# Altium schematic symbol library Regulator_Linear.SchLib: 1452 symbols (part 5 of 10) (continued)
## LT1117-2.85
designator *  value LT1117-2.85
ki_keywords: linear regulator ldo fixed positive; ki_description: 800mA Low-Dropout Linear Regulator, 2.85V fixed output, SOT-223/TO-263; ki_fp_filters: SOT?223* TO?263*; Supplier: https://www.analog.com/media/en/technical-documentation/data-sheets/1117fd.pdf
pins: 1 GND (power), 2 VO (power), 3 VI (power)

## LT1117-3.3
designator *  value LT1117-3.3
ki_keywords: linear regulator ldo fixed positive; ki_description: 800mA Low-Dropout Linear Regulator, 3.3V fixed output, SOT-223/TO-263; ki_fp_filters: SOT?223* TO?263*; Supplier: https://www.analog.com/media/en/technical-documentation/data-sheets/1117fd.pdf
pins: 1 GND (power), 2 VO (power), 3 VI (power)

## LT1117-5.0
designator *  value LT1117-5.0
ki_keywords: linear regulator ldo fixed positive; ki_description: 800mA Low-Dropout Linear Regulator, 5.0V fixed output, SOT-223/TO-263; ki_fp_filters: SOT?223* TO?263*; Supplier: https://www.analog.com/media/en/technical-documentation/data-sheets/1117fd.pdf
pins: 1 GND (power), 2 VO (power), 3 VI (power)

## LT1117-ADJ
designator *  value LT1117-ADJ
ki_keywords: linear regulator ldo adjustable positive; ki_description: 800mA Low-Dropout Linear Regulator, adjustable output, SOT-223/TO-263; ki_fp_filters: SOT?223* TO?263*; Supplier: https://www.analog.com/media/en/technical-documentation/data-sheets/1117fd.pdf
pins: 1 ADJ (in), 2 VO (power), 3 VI (power)

## LT1129-3.3_SO8
designator *  value LT1129-3.3_SO8
ki_keywords: LDO Linear Regulator positive fixed; ki_description: 700mA Micropower Low Dropout Linear Regulator, 3.3V output voltage, SO-8; ki_fp_filters: SOIC*3.9x4.9mm*P1.27mm*; Footprint: Package_SO:SOIC-8_3.9x4.9mm_P1.27mm; Supplier: https://www.analog.com/media/en/technical-documentation/data-sheets/112935ff.pdf
footprint SOIC-8_3.9x4.9mm_P1.27mm
pins: 1 OUT (power), 2 SENSE (in), 3 GND (power), 4 NC (in) hidden, 5 ~{{SHDN}} (in), 6 GND hidden, 7 GND hidden, 8 IN (power)

## LT1129-3.3_SOT223
designator *  value LT1129-3.3_SOT223
ki_keywords: REGULATOR LDO fixed positive; ki_description: 700mA Micropower Low drop-out regulator, Fixed Output 3.3V, SOT-223; ki_fp_filters: SOT?223*; Footprint: Package_TO_SOT_SMD:SOT-223-3_TabPin2; Supplier: https://www.analog.com/media/en/technical-documentation/data-sheets/112935ff.pdf
footprint SOT-223-3_TabPin2
pins: 1 VI (power), 2 GND (power), 3 VO (power)

## LT1129-3.3_TO220_TO263
designator *  value LT1129-3.3_TO220_TO263
ki_keywords: LDO Linear Regulator positive fixed; ki_description: 700mA Micropower Low Dropout Linear Regulator, 3.3V output voltage, TO-220-5/TO-263-5; ki_fp_filters: TO?220*Vertical*StaggerOdd* TO?263*TabPin3*; Supplier: https://www.analog.com/media/en/technical-documentation/data-sheets/112935ff.pdf
pins: 1 OUT (power), 2 SENSE (in), 3 GND (power), 4 ~{{SHDN}} (in), 5 IN (power)

## LT1129-5.0_SO8
designator *  value LT1129-5.0_SO8
ki_keywords: LDO Linear Regulator positive fixed; ki_description: 700mA Micropower Low Dropout Linear Regulator, 5.0V output voltage, SO-8; ki_fp_filters: SOIC*3.9x4.9mm*P1.27mm*; Footprint: Package_SO:SOIC-8_3.9x4.9mm_P1.27mm; Supplier: https://www.analog.com/media/en/technical-documentation/data-sheets/112935ff.pdf
footprint SOIC-8_3.9x4.9mm_P1.27mm
pins: 1 OUT (power), 2 SENSE (in), 3 GND (power), 4 NC (in) hidden, 5 ~{{SHDN}} (in), 6 GND hidden, 7 GND hidden, 8 IN (power)

## LT1129-5.0_SOT223
designator *  value LT1129-5.0_SOT223
ki_keywords: REGULATOR LDO Fixed Positive; ki_description: 700mA Micropower Low drop-out regulator, Fixed Output 5.0V, SOT-223; ki_fp_filters: SOT?223*; Footprint: Package_TO_SOT_SMD:SOT-223-3_TabPin2; Supplier: https://www.analog.com/media/en/technical-documentation/data-sheets/112935ff.pdf
footprint SOT-223-3_TabPin2
pins: 1 VI (power), 2 GND (power), 3 VO (power)

## LT1129-5.0_TO220_TO263
designator *  value LT1129-5.0_TO220_TO263
ki_keywords: LDO Linear Regulator positive fixed; ki_description: 700mA Micropower Low Dropout Linear Regulator, 5.0V output voltage, TO-220-5/TO-263-5; ki_fp_filters: TO?220*Vertical*StaggerOdd* TO?263*TabPin3*; Supplier: https://www.analog.com/media/en/technical-documentation/data-sheets/112935ff.pdf
pins: 1 OUT (power), 2 SENSE (in), 3 GND (power), 4 ~{{SHDN}} (in), 5 IN (power)

## LT1129-ADJ_SO8
designator *  value LT1129-ADJ_SO8
ki_keywords: LDO Linear Regulator positive adjustable; ki_description: 700mA Micropower Low Dropout Linear Regulator, adjustable output voltage, SO-8; ki_fp_filters: SOIC*3.9x4.9mm*P1.27mm*; Footprint: Package_SO:SOIC-8_3.9x4.9mm_P1.27mm; Supplier: https://www.analog.com/media/en/technical-documentation/data-sheets/112935ff.pdf
footprint SOIC-8_3.9x4.9mm_P1.27mm
pins: 1 OUT (power), 2 ADJ (in), 3 GND (power), 4 NC (in) hidden, 5 ~{{SHDN}} (in), 6 GND hidden, 7 GND hidden, 8 IN (power)

## LT1129-ADJ_TO220_TO263
designator *  value LT1129-ADJ_TO220_TO263
ki_keywords: LDO Linear Regulator positive adjustable; ki_description: 700mA Micropower Low Dropout Linear Regulator, adjustable output voltage, TO-220-5/TO-263-5; ki_fp_filters: TO?220*Vertical*StaggerOdd* TO?263*TabPin3*; Supplier: https://www.analog.com/media/en/technical-documentation/data-sheets/112935ff.pdf
pins: 1 OUT (power), 2 ADJ (in), 3 GND (power), 4 ~{{SHDN}} (in), 5 IN (power)

## LT1175-5_SO8_DIP8
designator *  value LT1175-5_SO8_DIP8
ki_keywords: linear regulator LDO negative fixed; ki_description: 500mA Negative Low Dropout Micropower Regulator, fixed output voltage -5V, SO-8/DIP-8; ki_fp_filters: SOIC*3.9x4.9mm*P1.27mm* DIP*W7.62mm*; Supplier: https://www.analog.com/media/en/technical-documentation/data-sheets/1175ff.pdf
pins: 1 Vin (power), 2 ILIM2 (in), 3 OUT (power), 4 SENSE (in), 5 GND (power), 6 ~{{SHDN}} (in), 7 ILIM4 (in), 8 Vin hidden

## LT1175-5_SOT223
designator *  value LT1175-5_SOT223
ki_keywords: linear regulator LDO negative fixed; ki_description: 500mA Negative Low Dropout Micropower Regulator, fixed output voltage -5V, SOT-223; ki_fp_filters: SOT?223*; Footprint: Package_TO_SOT_SMD:SOT-223-3_TabPin2; Supplier: https://www.analog.com/media/en/technical-documentation/data-sheets/1175ff.pdf
footprint SOT-223-3_TabPin2
pins: 1 OUT (power), 2 IN (power), 3 GND (power)

## LT1175-5_TO263_TO220
designator *  value LT1175-5_TO263_TO220
ki_keywords: linear regulator LDO negative fixed; ki_description: 500mA Negative Low Dropout Micropower Regulator, fixed output voltage -5V, TO-220-5/TO-263; ki_fp_filters: TO?263* TO?220*; Supplier: https://www.analog.com/media/en/technical-documentation/data-sheets/1175ff.pdf
pins: 1 OUT (power), 2 SENSE (in), 3 IN (power), 4 GND (power), 5 ~{{SHDN}} (in)

## LT1175-ADJ_SO8_DIP8
designator *  value LT1175-ADJ_SO8_DIP8
ki_keywords: linear regulator LDO negative adjustable; ki_description: 500mA Negative Low Dropout Micropower Regulator, adjustable output voltage, SO-8/DIP-8; ki_fp_filters: SOIC*3.9x4.9mm*P1.27mm* DIP*W7.62mm*; Supplier: https://www.analog.com/media/en/technical-documentation/data-sheets/1175ff.pdf
pins: 1 Vin (power), 2 ILIM2 (in), 3 OUT (power), 4 SENSE (in), 5 GND (power), 6 ~{{SHDN}} (in), 7 ILIM4 (in), 8 Vin hidden

## LT1175-ADJ_SOT223
designator *  value LT1175-ADJ_SOT223
ki_keywords: linear regulator LDO negative adjustable; ki_description: 500mA Negative Low Dropout Micropower Regulator, adjustable output voltage, SOT-223; ki_fp_filters: SOT?223*; Footprint: Package_TO_SOT_SMD:SOT-223-3_TabPin2; Supplier: https://www.analog.com/media/en/technical-documentation/data-sheets/1175ff.pdf
footprint SOT-223-3_TabPin2
pins: 1 OUT (power), 2 IN (power), 3 GND (power)

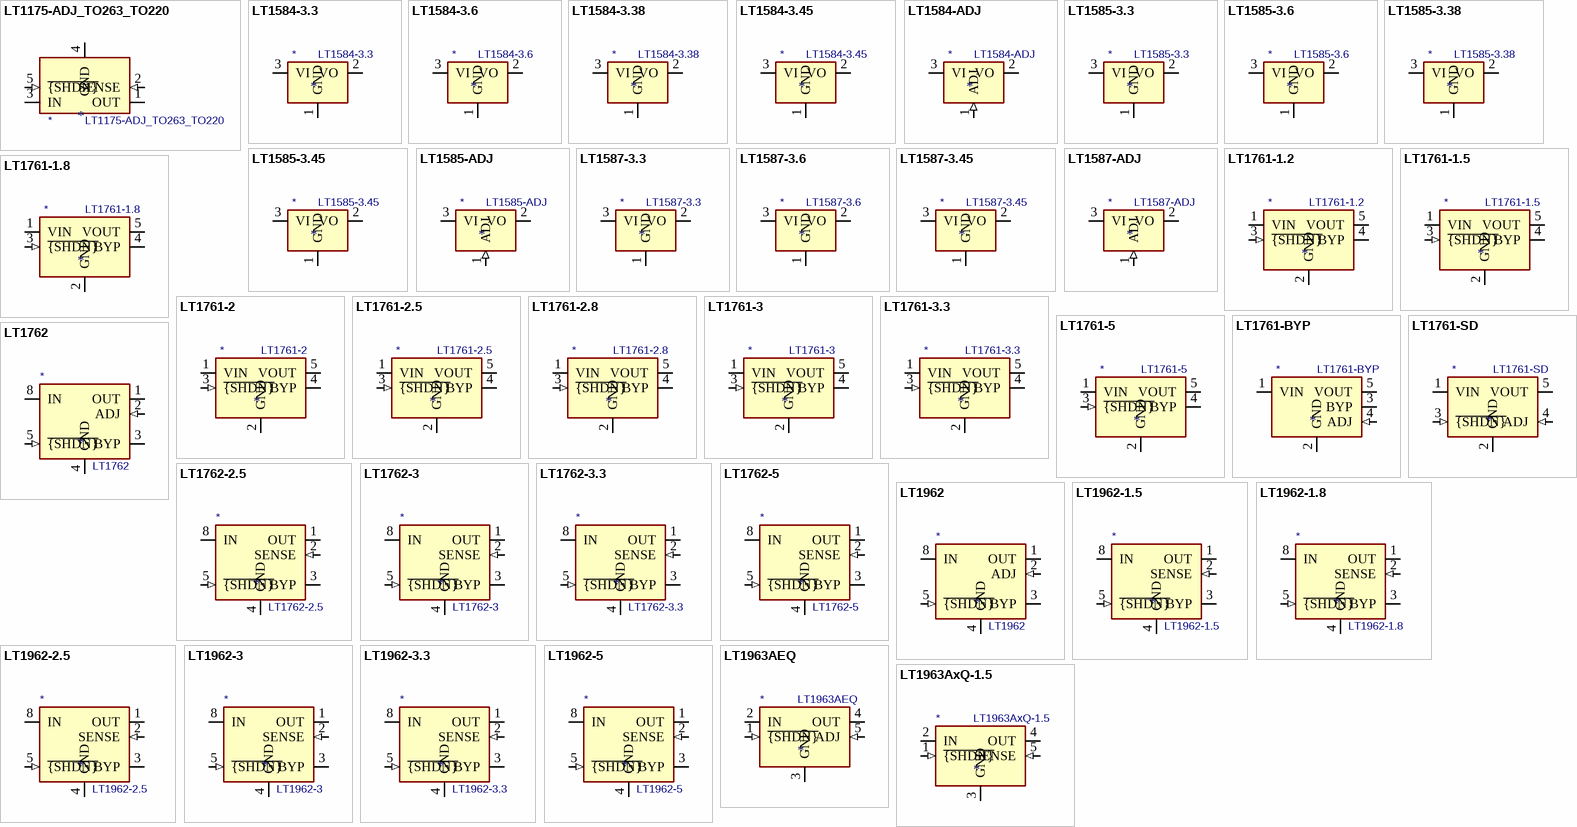
[diagram p18: symbols LT1175-ADJ_TO263_TO220 to LT1963AxQ-1.5]

## LT1175-ADJ_TO263_TO220
designator *  value LT1175-ADJ_TO263_TO220
ki_keywords: linear regulator LDO negative adjustable; ki_description: 500mA Negative Low Dropout Micropower Regulator, adjustable output voltage, TO-220-5/TO-263; ki_fp_filters: TO?263* TO?220*; Supplier: https://www.analog.com/media/en/technical-documentation/data-sheets/1175ff.pdf
pins: 1 OUT (power), 2 SENSE (in), 3 IN (power), 4 GND (power), 5 ~{{SHDN}} (in)

## LT1584-3.3
designator *  value LT1584-3.3
ki_keywords: Voltage Regulator 7A Positive Fixed; ki_description: Positive 7A 35V Low Dropout Fast Response Linear Regulator, Fixed Output 3.3V, TO-220/TO-263; ki_fp_filters: TO?220*; Footprint: Package_TO_SOT_THT:TO-220-3_Vertical; Supplier: https://www.analog.com/media/en/technical-documentation/data-sheets/158457a.pdf
footprint TO-220-3_Vertical
pins: 1 GND (power), 2 VO (power), 3 VI (power)

## LT1584-3.6
designator *  value LT1584-3.6
ki_keywords: Voltage Regulator 7A Positive Fixed; ki_description: Positive 7A 35V Low Dropout Fast Response Linear Regulator, Fixed Output 3.6V, TO-220/TO-263; ki_fp_filters: TO?220*; Footprint: Package_TO_SOT_THT:TO-220-3_Vertical; Supplier: https://www.analog.com/media/en/technical-documentation/data-sheets/158457a.pdf
footprint TO-220-3_Vertical
pins: 1 GND (power), 2 VO (power), 3 VI (power)

## LT1584-3.38
designator *  value LT1584-3.38
ki_keywords: Voltage Regulator 7A Positive Fixed; ki_description: Positive 7A 35V Low Dropout Fast Response Linear Regulator, Fixed Output 3.38V, TO-220/TO-263; ki_fp_filters: TO?220*; Footprint: Package_TO_SOT_THT:TO-220-3_Vertical; Supplier: https://www.analog.com/media/en/technical-documentation/data-sheets/158457a.pdf
footprint TO-220-3_Vertical
pins: 1 GND (power), 2 VO (power), 3 VI (power)

## LT1584-3.45
designator *  value LT1584-3.45
ki_keywords: Voltage Regulator 7A Positive Fixed; ki_description: Positive 7A 35V Low Dropout Fast Response Linear Regulator, Fixed Output 3.45V, TO-220/TO-263; ki_fp_filters: TO?220*; Footprint: Package_TO_SOT_THT:TO-220-3_Vertical; Supplier: https://www.analog.com/media/en/technical-documentation/data-sheets/158457a.pdf
footprint TO-220-3_Vertical
pins: 1 GND (power), 2 VO (power), 3 VI (power)

## LT1584-ADJ
designator *  value LT1584-ADJ
ki_keywords: Voltage Regulator 7A Positive Adjustable; ki_description: Positive 7A 35V Low Dropout Fast Response Linear Regulator, Adjustable Output, TO-220; ki_fp_filters: TO?220*; Footprint: Package_TO_SOT_THT:TO-220-3_Vertical; Supplier: https://www.analog.com/media/en/technical-documentation/data-sheets/158457a.pdf
footprint TO-220-3_Vertical
pins: 1 ADJ (in), 2 VO (power), 3 VI (power)

## LT1585-3.3
designator *  value LT1585-3.3
ki_keywords: Voltage Regulator 4.6A Positive Fixed; ki_description: Positive 4.6A 35V Low Dropout Fast Response Linear Regulator, Fixed Output 3.3V, TO-220/TO-263; ki_fp_filters: TO?220* TO?263*; Supplier: https://www.analog.com/media/en/technical-documentation/data-sheets/158457a.pdf
pins: 1 GND (power), 2 VO (power), 3 VI (power)

## LT1585-3.6
designator *  value LT1585-3.6
ki_keywords: Voltage Regulator 4.6A Positive Fixed; ki_description: Positive 4.6A 35V Low Dropout Fast Response Linear Regulator, Fixed Output 3.6V, TO-220/TO-263; ki_fp_filters: TO?220* TO?263*; Supplier: https://www.analog.com/media/en/technical-documentation/data-sheets/158457a.pdf
pins: 1 GND (power), 2 VO (power), 3 VI (power)

## LT1585-3.38
designator *  value LT1585-3.38
ki_keywords: Voltage Regulator 4.6A Positive Fixed; ki_description: Positive 4.6A 35V Low Dropout Fast Response Linear Regulator, Fixed Output 3.38V, TO-220/TO-263; ki_fp_filters: TO?220* TO?263*; Supplier: https://www.analog.com/media/en/technical-documentation/data-sheets/158457a.pdf
pins: 1 GND (power), 2 VO (power), 3 VI (power)

## LT1585-3.45
designator *  value LT1585-3.45
ki_keywords: Voltage Regulator 4.6A Positive Fixed; ki_description: Positive 4.6A 35V Low Dropout Fast Response Linear Regulator, Fixed Output 3.45V, TO-220/TO-263; ki_fp_filters: TO?220* TO?263*; Supplier: https://www.analog.com/media/en/technical-documentation/data-sheets/158457a.pdf
pins: 1 GND (power), 2 VO (power), 3 VI (power)

## LT1585-ADJ
designator *  value LT1585-ADJ
ki_keywords: Voltage Regulator 4.6A Positive Adjustable; ki_description: Positive 4.6A 35V Low Dropout Fast Response Linear Regulator, Adjustable Output, TO-220/TO-263; ki_fp_filters: TO?220* TO?263*; Supplier: https://www.analog.com/media/en/technical-documentation/data-sheets/158457a.pdf
pins: 1 ADJ (in), 2 VO (power), 3 VI (power)

## LT1587-3.3
designator *  value LT1587-3.3
ki_keywords: Voltage Regulator 3A Positive Fixed; ki_description: Positive 3A 35V Low Dropout Fast Response Linear Regulator, Fixed Output 3.3V, TO-220/TO-263; ki_fp_filters: TO?220* TO?263*; Supplier: https://www.analog.com/media/en/technical-documentation/data-sheets/158457a.pdf
pins: 1 GND (power), 2 VO (power), 3 VI (power)

## LT1587-3.6
designator *  value LT1587-3.6
ki_keywords: Voltage Regulator 3A Positive Fixed; ki_description: Positive 3A 35V Low Dropout Fast Response Linear Regulator, Fixed Output 3.6V, TO-220/TO-263; ki_fp_filters: TO?220* TO?263*; Supplier: https://www.analog.com/media/en/technical-documentation/data-sheets/158457a.pdf
pins: 1 GND (power), 2 VO (power), 3 VI (power)

## LT1587-3.45
designator *  value LT1587-3.45
ki_keywords: Voltage Regulator 3A Positive Fixed; ki_description: Positive 3A 35V Low Dropout Fast Response Linear Regulator, Fixed Output 3.45V, TO-220/TO-263; ki_fp_filters: TO?220* TO?263*; Supplier: https://www.analog.com/media/en/technical-documentation/data-sheets/158457a.pdf
pins: 1 GND (power), 2 VO (power), 3 VI (power)

## LT1587-ADJ
designator *  value LT1587-ADJ
ki_keywords: Voltage Regulator 3A Positive Adjustable; ki_description: Positive 3A 35V Low Dropout Fast Response Linear Regulator, Adjustable Output, TO-220/TO-263; ki_fp_filters: TO?220* TO?263*; Supplier: https://www.analog.com/media/en/technical-documentation/data-sheets/158457a.pdf
pins: 1 ADJ (in), 2 VO (power), 3 VI (power)

## LT1761-1.2
designator *  value LT1761-1.2
ki_keywords: REGULATOR POWER LDO POSITIVE; ki_description: MICROPOWER Low Noise 1.2V 100mA LDO regulator, TSOT-23-5; ki_fp_filters: TSOT?23*; Footprint: Package_TO_SOT_SMD:TSOT-23-5; Supplier: https://www.analog.com/media/en/technical-documentation/data-sheets/1761sff.pdf
footprint TSOT-23-5
pins: 1 VIN (power), 2 GND (power), 3 ~{{SHDN}} (in), 4 BYP, 5 VOUT (power)

## LT1761-1.5
designator *  value LT1761-1.5
ki_keywords: POWER LDO REGULATOR POSITIVE; ki_description: MICROPOWER Low Noise 1.5V 100mA LDO regulator, TSOT-23-5; ki_fp_filters: TSOT?23*; Footprint: Package_TO_SOT_SMD:TSOT-23-5; Supplier: https://www.analog.com/media/en/technical-documentation/data-sheets/1761sff.pdf
footprint TSOT-23-5
pins: 1 VIN (power), 2 GND (power), 3 ~{{SHDN}} (in), 4 BYP, 5 VOUT (power)

## LT1761-1.8
designator *  value LT1761-1.8
ki_keywords: REGULATOR POSITIVE POWER LDO; ki_description: MICROPOWER Low Noise 1.8V 100mA LDO regulator, TSOT-23-5; ki_fp_filters: TSOT?23*; Footprint: Package_TO_SOT_SMD:TSOT-23-5; Supplier: https://www.analog.com/media/en/technical-documentation/data-sheets/1761sff.pdf
footprint TSOT-23-5
pins: 1 VIN (power), 2 GND (power), 3 ~{{SHDN}} (in), 4 BYP, 5 VOUT (power)

## LT1761-2
designator *  value LT1761-2
ki_keywords: REGULATOR POSITIVE POWER LDO; ki_description: MICROPOWER Low Noise 2V 100mA LDO regulator, TSOT-23-5; ki_fp_filters: TSOT?23*; Footprint: Package_TO_SOT_SMD:TSOT-23-5; Supplier: https://www.analog.com/media/en/technical-documentation/data-sheets/1761sff.pdf
footprint TSOT-23-5
pins: 1 VIN (power), 2 GND (power), 3 ~{{SHDN}} (in), 4 BYP, 5 VOUT (power)

## LT1761-2.5
designator *  value LT1761-2.5
ki_keywords: REGULATOR POSITIVE POWER LDO; ki_description: MICROPOWER Low Noise 2.5V 100mA LDO regulator, TSOT-23-5; ki_fp_filters: TSOT?23*; Footprint: Package_TO_SOT_SMD:TSOT-23-5; Supplier: https://www.analog.com/media/en/technical-documentation/data-sheets/1761sff.pdf
footprint TSOT-23-5
pins: 1 VIN (power), 2 GND (power), 3 ~{{SHDN}} (in), 4 BYP, 5 VOUT (power)

## LT1761-2.8
designator *  value LT1761-2.8
ki_keywords: REGULATOR POSITIVE POWER LDO; ki_description: MICROPOWER Low Noise 2.8V 100mA LDO regulator, TSOT-23-5; ki_fp_filters: TSOT?23*; Footprint: Package_TO_SOT_SMD:TSOT-23-5; Supplier: https://www.analog.com/media/en/technical-documentation/data-sheets/1761sff.pdf
footprint TSOT-23-5
pins: 1 VIN (power), 2 GND (power), 3 ~{{SHDN}} (in), 4 BYP, 5 VOUT (power)

## LT1761-3
designator *  value LT1761-3
ki_keywords: REGULATOR POSITIVE POWER LDO; ki_description: MICROPOWER Low Noise 3V 100mA LDO regulator, TSOT-23-5; ki_fp_filters: TSOT?23*; Footprint: Package_TO_SOT_SMD:TSOT-23-5; Supplier: https://www.analog.com/media/en/technical-documentation/data-sheets/1761sff.pdf
footprint TSOT-23-5
pins: 1 VIN (power), 2 GND (power), 3 ~{{SHDN}} (in), 4 BYP, 5 VOUT (power)

## LT1761-3.3
designator *  value LT1761-3.3
ki_keywords: REGULATOR POSITIVE POWER LDO; ki_description: MICROPOWER Low Noise 3.3V 100mA LDO regulator, TSOT-23-5; ki_fp_filters: TSOT?23*; Footprint: Package_TO_SOT_SMD:TSOT-23-5; Supplier: https://www.analog.com/media/en/technical-documentation/data-sheets/1761sff.pdf
footprint TSOT-23-5
pins: 1 VIN (power), 2 GND (power), 3 ~{{SHDN}} (in), 4 BYP, 5 VOUT (power)

## LT1761-5
designator *  value LT1761-5
ki_keywords: REGULATOR POSITIVE POWER LDO; ki_description: MICROPOWER Low Noise 5V 100mA LDO regulator, TSOT-23-5; ki_fp_filters: TSOT?23*; Footprint: Package_TO_SOT_SMD:TSOT-23-5; Supplier: https://www.analog.com/media/en/technical-documentation/data-sheets/1761sff.pdf
footprint TSOT-23-5
pins: 1 VIN (power), 2 GND (power), 3 ~{{SHDN}} (in), 4 BYP, 5 VOUT (power)

## LT1761-BYP
designator *  value LT1761-BYP
ki_keywords: REGULATOR POSITIVE POWER LDO adjustable; ki_description: MICROPOWER 100mA LDO adjustable regulator, TSOT-23-5; ki_fp_filters: TSOT?23*; Footprint: Package_TO_SOT_SMD:TSOT-23-5; Supplier: https://www.analog.com/media/en/technical-documentation/data-sheets/1761sff.pdf
footprint TSOT-23-5
pins: 1 VIN (power), 2 GND (power), 3 BYP, 4 ADJ (in), 5 VOUT (power)

## LT1761-SD
designator *  value LT1761-SD
ki_keywords: REGULATOR POSITIVE POWER LDO adjustable; ki_description: MICROPOWER 100mA LDO adjustable regulator, TSOT-23-5; ki_fp_filters: TSOT?23*; Footprint: Package_TO_SOT_SMD:TSOT-23-5; Supplier: https://www.analog.com/media/en/technical-documentation/data-sheets/1761sff.pdf
footprint TSOT-23-5
pins: 1 VIN (power), 2 GND (power), 3 ~{{SHDN}} (in), 4 ADJ (in), 5 VOUT (power)

## LT1762
designator *  value LT1762
ki_keywords: LDO ADJ; ki_description: 150mA, Adjustable, Low Noise, Micropower LDO Regulator, MSOP-8; ki_fp_filters: MSOP*3x3mm*P0.65mm*; Footprint: Package_SO:MSOP-8_3x3mm_P0.65mm; Supplier: https://www.analog.com/media/en/technical-documentation/data-sheets/LT1762.pdf
footprint MSOP-8_3x3mm_P0.65mm
pins: 1 OUT (power), 2 ADJ (in), 3 BYP, 4 GND (power), 5 ~{{SHDN}} (in), 6 NC (in) hidden, 7 NC (in) hidden, 8 IN (power)

## LT1762-2.5
designator *  value LT1762-2.5
ki_keywords: LDO ADJ; ki_description: 2.5V, 150mA, Low Noise, Micropower LDO Regulator, MSOP-8; ki_fp_filters: MSOP*3x3mm*P0.65mm*; Footprint: Package_SO:MSOP-8_3x3mm_P0.65mm; Supplier: https://www.analog.com/media/en/technical-documentation/data-sheets/LT1762.pdf
footprint MSOP-8_3x3mm_P0.65mm
pins: 1 OUT (power), 2 SENSE (in), 3 BYP, 4 GND (power), 5 ~{{SHDN}} (in), 6 NC (in) hidden, 7 NC (in) hidden, 8 IN (power)

## LT1762-3
designator *  value LT1762-3
ki_keywords: LDO ADJ; ki_description: 3V, 150mA, Low Noise, Micropower LDO Regulator, MSOP-8; ki_fp_filters: MSOP*3x3mm*P0.65mm*; Footprint: Package_SO:MSOP-8_3x3mm_P0.65mm; Supplier: https://www.analog.com/media/en/technical-documentation/data-sheets/LT1762.pdf
footprint MSOP-8_3x3mm_P0.65mm
pins: 1 OUT (power), 2 SENSE (in), 3 BYP, 4 GND (power), 5 ~{{SHDN}} (in), 6 NC (in) hidden, 7 NC (in) hidden, 8 IN (power)

## LT1762-3.3
designator *  value LT1762-3.3
ki_keywords: LDO ADJ; ki_description: 3.3V, 150mA, Low Noise, Micropower LDO Regulator, MSOP-8; ki_fp_filters: MSOP*3x3mm*P0.65mm*; Footprint: Package_SO:MSOP-8_3x3mm_P0.65mm; Supplier: https://www.analog.com/media/en/technical-documentation/data-sheets/LT1762.pdf
footprint MSOP-8_3x3mm_P0.65mm
pins: 1 OUT (power), 2 SENSE (in), 3 BYP, 4 GND (power), 5 ~{{SHDN}} (in), 6 NC (in) hidden, 7 NC (in) hidden, 8 IN (power)

## LT1762-5
designator *  value LT1762-5
ki_keywords: LDO ADJ; ki_description: 5V, 150mA, Low Noise, Micropower LDO Regulator, MSOP-8; ki_fp_filters: MSOP*3x3mm*P0.65mm*; Footprint: Package_SO:MSOP-8_3x3mm_P0.65mm; Supplier: https://www.analog.com/media/en/technical-documentation/data-sheets/LT1762.pdf
footprint MSOP-8_3x3mm_P0.65mm
pins: 1 OUT (power), 2 SENSE (in), 3 BYP, 4 GND (power), 5 ~{{SHDN}} (in), 6 NC (in) hidden, 7 NC (in) hidden, 8 IN (power)

## LT1962
designator *  value LT1962
ki_keywords: LDO ADJ; ki_description: 300mA, Adjustable, Low Noise, Micropower LDO Regulator, MSOP-8; ki_fp_filters: MSOP*3x3mm*P0.65mm*; Footprint: Package_SO:MSOP-8_3x3mm_P0.65mm; Supplier: https://www.analog.com/media/en/technical-documentation/data-sheets/1962fb.pdf
footprint MSOP-8_3x3mm_P0.65mm
pins: 1 OUT (power), 2 ADJ (in), 3 BYP, 4 GND (power), 5 ~{{SHDN}} (in), 6 NC (in) hidden, 7 NC (in) hidden, 8 IN (power)

## LT1962-1.5
designator *  value LT1962-1.5
ki_keywords: LDO 1.5V; ki_description: 1.5V, 300mA, Low Noise, Micropower LDO Regulator, MSOP-8; ki_fp_filters: MSOP*3x3mm*P0.65mm*; Footprint: Package_SO:MSOP-8_3x3mm_P0.65mm; Supplier: https://www.analog.com/media/en/technical-documentation/data-sheets/1962fb.pdf
footprint MSOP-8_3x3mm_P0.65mm
pins: 1 OUT (power), 2 SENSE (in), 3 BYP, 4 GND (power), 5 ~{{SHDN}} (in), 6 NC (in) hidden, 7 NC (in) hidden, 8 IN (power)

## LT1962-1.8
designator *  value LT1962-1.8
ki_keywords: LDO 1.8V; ki_description: 1.8V, 300mA, Low Noise, Micropower LDO Regulator, MSOP-8; ki_fp_filters: MSOP*3x3mm*P0.65mm*; Footprint: Package_SO:MSOP-8_3x3mm_P0.65mm; Supplier: https://www.analog.com/media/en/technical-documentation/data-sheets/1962fb.pdf
footprint MSOP-8_3x3mm_P0.65mm
pins: 1 OUT (power), 2 SENSE (in), 3 BYP, 4 GND (power), 5 ~{{SHDN}} (in), 6 NC (in) hidden, 7 NC (in) hidden, 8 IN (power)

## LT1962-2.5
designator *  value LT1962-2.5
ki_keywords: LDO 2.5V; ki_description: 2.5V, 300mA, Low Noise, Micropower LDO Regulator, MSOP-8; ki_fp_filters: MSOP*3x3mm*P0.65mm*; Footprint: Package_SO:MSOP-8_3x3mm_P0.65mm; Supplier: https://www.analog.com/media/en/technical-documentation/data-sheets/1962fb.pdf
footprint MSOP-8_3x3mm_P0.65mm
pins: 1 OUT (power), 2 SENSE (in), 3 BYP, 4 GND (power), 5 ~{{SHDN}} (in), 6 NC (in) hidden, 7 NC (in) hidden, 8 IN (power)

## LT1962-3
designator *  value LT1962-3
ki_keywords: LDO 3V; ki_description: 3.0V, 300mA, Low Noise, Micropower LDO Regulator, MSOP-8; ki_fp_filters: MSOP*3x3mm*P0.65mm*; Footprint: Package_SO:MSOP-8_3x3mm_P0.65mm; Supplier: https://www.analog.com/media/en/technical-documentation/data-sheets/1962fb.pdf
footprint MSOP-8_3x3mm_P0.65mm
pins: 1 OUT (power), 2 SENSE (in), 3 BYP, 4 GND (power), 5 ~{{SHDN}} (in), 6 NC (in) hidden, 7 NC (in) hidden, 8 IN (power)

## LT1962-3.3
designator *  value LT1962-3.3
ki_keywords: LDO 3.3V; ki_description: 3.3V, 300mA, Low Noise, Micropower LDO Regulator, MSOP-8; ki_fp_filters: MSOP*3x3mm*P0.65mm*; Footprint: Package_SO:MSOP-8_3x3mm_P0.65mm; Supplier: https://www.analog.com/media/en/technical-documentation/data-sheets/1962fb.pdf
footprint MSOP-8_3x3mm_P0.65mm
pins: 1 OUT (power), 2 SENSE (in), 3 BYP, 4 GND (power), 5 ~{{SHDN}} (in), 6 NC (in) hidden, 7 NC (in) hidden, 8 IN (power)

## LT1962-5
designator *  value LT1962-5
ki_keywords: LDO 5V; ki_description: 5.0V, 300mA, Low Noise, Micropower LDO Regulator, MSOP-8; ki_fp_filters: MSOP*3x3mm*P0.65mm*; Footprint: Package_SO:MSOP-8_3x3mm_P0.65mm; Supplier: https://www.analog.com/media/en/technical-documentation/data-sheets/1962fb.pdf
footprint MSOP-8_3x3mm_P0.65mm
pins: 1 OUT (power), 2 SENSE (in), 3 BYP, 4 GND (power), 5 ~{{SHDN}} (in), 6 NC (in) hidden, 7 NC (in) hidden, 8 IN (power)

## LT1963AEQ
designator *  value LT1963AEQ
ki_keywords: low noise voltage regulator; ki_description: 1.5A, Adjustable, Low Noise, Linear Voltage Regulator, TO-263-5; ki_fp_filters: TO*263*; Footprint: Package_TO_SOT_SMD:TO-263-5_TabPin3; Supplier: https://www.analog.com/media/en/technical-documentation/data-sheets/1963aff.pdf
footprint TO-263-5_TabPin3
pins: 1 ~{{SHDN}} (in), 2 IN (power), 3 GND (power), 4 OUT (power), 5 ADJ (in)

## LT1963AxQ-1.5
designator *  value LT1963AxQ-1.5
ki_keywords: voltage regulator linear ldo; ki_description: 1.5V, 1.5A, Low Noise, Fast Transient Response LDO Regulator, TO-263-5; ki_fp_filters: TO*263*; Footprint: Package_TO_SOT_SMD:TO-263-5_TabPin3; Supplier: https://www.analog.com/media/en/technical-documentation/data-sheets/1963aff.pdf
footprint TO-263-5_TabPin3
pins: 1 ~{{SHDN}} (in), 2 IN (power), 3 GND (power), 4 OUT (power), 5 SENSE (in)

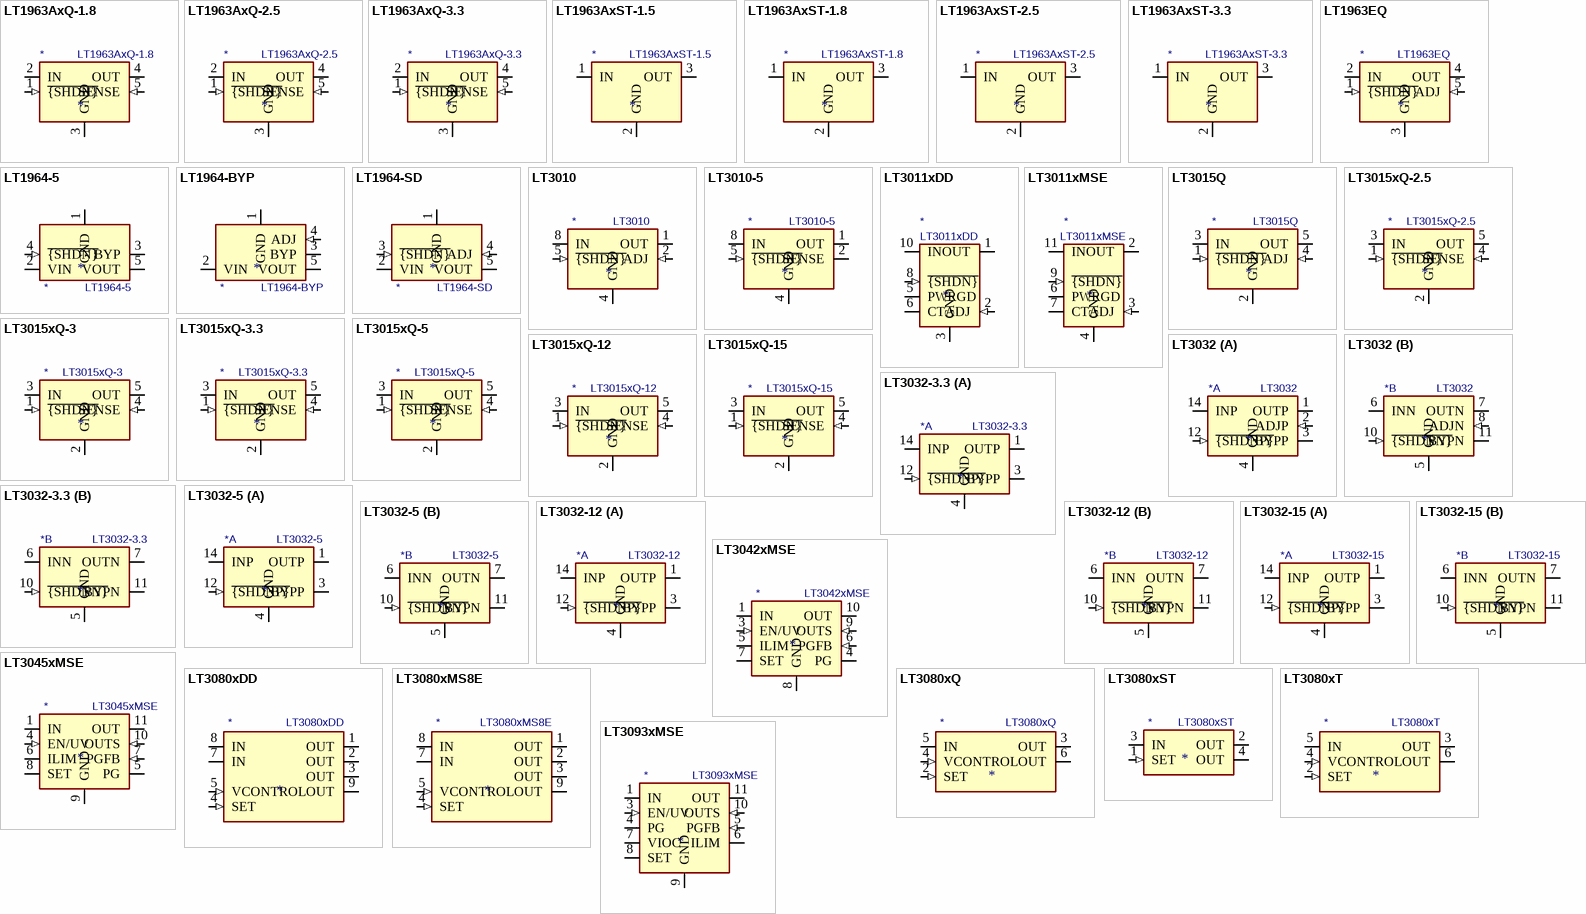
[diagram p19: symbols LT1963AxQ-1.8 to LT3093xMSE]

## LT1963AxQ-1.8
designator *  value LT1963AxQ-1.8
ki_keywords: voltage regulator linear ldo; ki_description: 1.8V, 1.5A, Low Noise, Fast Transient Response LDO Regulator, TO-263-5; ki_fp_filters: TO*263*; Footprint: Package_TO_SOT_SMD:TO-263-5_TabPin3; Supplier: https://www.analog.com/media/en/technical-documentation/data-sheets/1963aff.pdf
footprint TO-263-5_TabPin3
pins: 1 ~{{SHDN}} (in), 2 IN (power), 3 GND (power), 4 OUT (power), 5 SENSE (in)

## LT1963AxQ-2.5
designator *  value LT1963AxQ-2.5
ki_keywords: voltage regulator linear ldo; ki_description: 2.5V, 1.5A, Low Noise, Fast Transient Response LDO Regulator, TO-263-5; ki_fp_filters: TO*263*; Footprint: Package_TO_SOT_SMD:TO-263-5_TabPin3; Supplier: https://www.analog.com/media/en/technical-documentation/data-sheets/1963aff.pdf
footprint TO-263-5_TabPin3
pins: 1 ~{{SHDN}} (in), 2 IN (power), 3 GND (power), 4 OUT (power), 5 SENSE (in)

## LT1963AxQ-3.3
designator *  value LT1963AxQ-3.3
ki_keywords: voltage regulator linear ldo; ki_description: 3.3V, 1.5A, Low Noise, Fast Transient Response LDO Regulator, TO-263-5; ki_fp_filters: TO*263*; Footprint: Package_TO_SOT_SMD:TO-263-5_TabPin3; Supplier: https://www.analog.com/media/en/technical-documentation/data-sheets/1963aff.pdf
footprint TO-263-5_TabPin3
pins: 1 ~{{SHDN}} (in), 2 IN (power), 3 GND (power), 4 OUT (power), 5 SENSE (in)

## LT1963AxST-1.5
designator *  value LT1963AxST-1.5
ki_keywords: LDO voltage regulator fixed; ki_description: 1.5V, 1.5A, Low Noise, Fast Transient Response LDO Regulator, SOT-223; ki_fp_filters: SOT*223*; Footprint: Package_TO_SOT_SMD:SOT-223-3_TabPin2; Supplier: https://www.analog.com/media/en/technical-documentation/data-sheets/1963aff.pdf
footprint SOT-223-3_TabPin2
pins: 1 IN (power), 2 GND (power), 3 OUT (power)

## LT1963AxST-1.8
designator *  value LT1963AxST-1.8
ki_keywords: LDO voltage regulator fixed; ki_description: 1.8V, 1.5A, Low Noise, Fast Transient Response LDO Regulator, SOT-223; ki_fp_filters: SOT*223*; Footprint: Package_TO_SOT_SMD:SOT-223-3_TabPin2; Supplier: https://www.analog.com/media/en/technical-documentation/data-sheets/1963aff.pdf
footprint SOT-223-3_TabPin2
pins: 1 IN (power), 2 GND (power), 3 OUT (power)

## LT1963AxST-2.5
designator *  value LT1963AxST-2.5
ki_keywords: LDO voltage regulator fixed; ki_description: 2.5V, 1.5A, Low Noise, Fast Transient Response LDO Regulator, SOT-223; ki_fp_filters: SOT*223*; Footprint: Package_TO_SOT_SMD:SOT-223-3_TabPin2; Supplier: https://www.analog.com/media/en/technical-documentation/data-sheets/1963aff.pdf
footprint SOT-223-3_TabPin2
pins: 1 IN (power), 2 GND (power), 3 OUT (power)

## LT1963AxST-3.3
designator *  value LT1963AxST-3.3
ki_keywords: LDO voltage regulator fixed; ki_description: 3.3V, 1.5A, Low Noise, Fast Transient Response LDO Regulator, SOT-223; ki_fp_filters: SOT*223*; Footprint: Package_TO_SOT_SMD:SOT-223-3_TabPin2; Supplier: https://www.analog.com/media/en/technical-documentation/data-sheets/1963aff.pdf
footprint SOT-223-3_TabPin2
pins: 1 IN (power), 2 GND (power), 3 OUT (power)

## LT1963EQ
designator *  value LT1963EQ
ki_keywords: low noise voltage regulator; ki_description: 1.5A, Adjustable, Low Noise, Linear Voltage Regulator, TO-263-5; ki_fp_filters: TO*263*; Footprint: Package_TO_SOT_SMD:TO-263-5_TabPin3; Supplier: https://www.analog.com/media/en/technical-documentation/data-sheets/1963fc.pdf
footprint TO-263-5_TabPin3
pins: 1 ~{{SHDN}} (in), 2 IN (power), 3 GND (power), 4 OUT (power), 5 ADJ (in)

## LT1964-5
designator *  value LT1964-5
ki_keywords: REGULATOR POSITIVE POWER LDO fixed; ki_description: MICROPOWER 200mA Low Noise LDO negative regulator, fixed output -5V, TSOT-23-5; ki_fp_filters: TSOT?23*; Footprint: Package_TO_SOT_SMD:TSOT-23-5; Supplier: https://www.analog.com/media/en/technical-documentation/data-sheets/1964fb.pdf
footprint TSOT-23-5
pins: 1 GND (power), 2 VIN (power), 3 BYP, 4 ~{{SHDN}} (in), 5 VOUT (power)

## LT1964-BYP
designator *  value LT1964-BYP
ki_keywords: REGULATOR POSITIVE POWER LDO adjustable; ki_description: MICROPOWER 200mA Low Noise LDO negative regulator, adjustable output, TSOT-23-5; ki_fp_filters: TSOT?23*; Footprint: Package_TO_SOT_SMD:TSOT-23-5; Supplier: https://www.analog.com/media/en/technical-documentation/data-sheets/1964fb.pdf
footprint TSOT-23-5
pins: 1 GND (power), 2 VIN (power), 3 BYP, 4 ADJ (in), 5 VOUT (power)

## LT1964-SD
designator *  value LT1964-SD
ki_keywords: REGULATOR POSITIVE POWER LDO adjustable; ki_description: MICROPOWER 200mA Low Noise LDO negative regulator, adjustable output, TSOT-23-5; ki_fp_filters: TSOT?23*; Footprint: Package_TO_SOT_SMD:TSOT-23-5; Supplier: https://www.analog.com/media/en/technical-documentation/data-sheets/1964fb.pdf
footprint TSOT-23-5
pins: 1 GND (power), 2 VIN (power), 3 ~{{SHDN}} (in), 4 ADJ (in), 5 VOUT (power)

## LT3010
designator *  value LT3010
ki_keywords: REGULATOR POSITIVE POWER LDO adjustable; ki_description: 50mA 3-80V Micropower Low Dropout Regulator, adjustable output, MSOP-8; ki_fp_filters: MSOP*3x3mm*P0.65mm*; Footprint: Package_SO:MSOP-8-1EP_3x3mm_P0.65mm_EP1.68x1.88mm; Supplier: https://www.analog.com/media/en/technical-documentation/data-sheets/30105fe.pdf
footprint MSOP-8-1EP_3x3mm_P0.65mm_EP1.68x1.88mm
pins: 1 OUT (power), 2 ADJ (in), 3 NC (in) hidden, 4 GND (power), 5 ~{{SHDN}} (in), 6 NC (in) hidden, 7 NC (in) hidden, 8 IN (power), 9 GND hidden

## LT3010-5
designator *  value LT3010-5
ki_keywords: REGULATOR POSITIVE POWER LDO fixed; ki_description: 50mA 3-80V Micropower Low Dropout Regulator, fixed output 5V, MSOP-8; ki_fp_filters: MSOP*3x3mm*P0.65mm*; Footprint: Package_SO:MSOP-8-1EP_3x3mm_P0.65mm_EP1.68x1.88mm; Supplier: https://www.analog.com/media/en/technical-documentation/data-sheets/30105fe.pdf
footprint MSOP-8-1EP_3x3mm_P0.65mm_EP1.68x1.88mm
pins: 1 OUT (power), 2 SENSE, 3 NC (in) hidden, 4 GND (power), 5 ~{{SHDN}} (in), 6 NC (in) hidden, 7 NC (in) hidden, 8 IN (power), 9 GND hidden

## LT3011xDD
designator *  value LT3011xDD
ki_keywords: variable regulator; ki_description: 50mA, 3V to 80V Low Dropout Micropower Linear Regulator with PWRGD, DFN-10; ki_fp_filters: DFN*1EP*3x3mm*P0.5mm*; Footprint: Package_DFN_QFN:DFN-10-1EP_3x3mm_P0.5mm_EP1.65x2.38mm; Supplier: https://www.analog.com/media/en/technical-documentation/data-sheets/3011f.pdf
footprint DFN-10-1EP_3x3mm_P0.5mm_EP1.65x2.38mm
pins: 1 OUT (power), 2 ADJ (in), 3 GND (power), 4 NC (in) hidden, 5 PWRGD (oc), 6 CT, 7 NC (in) hidden, 8 ~{{SHDN}} (in), 9 NC (in) hidden, 10 IN (power), 11 GND hidden

## LT3011xMSE
designator *  value LT3011xMSE
ki_keywords: variable regulator; ki_description: 50mA, 3V to 80V Low Dropout Micropower Linear Regulator with PWRGD, MSOP-12; ki_fp_filters: MSOP*1EP*3x4mm*P0.65mm*; Footprint: Package_SO:MSOP-12-1EP_3x4mm_P0.65mm_EP1.65x2.85mm; Supplier: https://www.analog.com/media/en/technical-documentation/data-sheets/3011f.pdf
footprint MSOP-12-1EP_3x4mm_P0.65mm_EP1.65x2.85mm
pins: 1 NC (in) hidden, 2 OUT (power), 3 ADJ (in), 4 GND (power), 5 NC (in) hidden, 6 PWRGD (oc), 7 CT, 8 NC (in) hidden, 9 ~{{SHDN}} (in), 10 NC (in) hidden, 11 IN (power), 12 NC (in) hidden, 13 GND hidden

## LT3015Q
designator *  value LT3015Q
ki_keywords: low noise voltage regulator; ki_description: 1.5A, Adjustable, Low Noise, Negative Voltage Regulator, TO-263-5; ki_fp_filters: TO*263*; Footprint: Package_TO_SOT_SMD:TO-263-5_TabPin3; Supplier: https://www.analog.com/media/en/technical-documentation/data-sheets/3015fb.pdf
footprint TO-263-5_TabPin3
pins: 1 ~{{SHDN}} (in), 2 GND (power), 3 IN (power), 4 ADJ (in), 5 OUT (power)

## LT3015xQ-2.5
designator *  value LT3015xQ-2.5
ki_keywords: negative voltage regulator; ki_description: -2.5V, 1.5A, Low Noise, Negative Linear Regulator with Precision Current Limit, TO-263-5; ki_fp_filters: TO*263*; Footprint: Package_TO_SOT_SMD:TO-263-5_TabPin3; Supplier: https://www.analog.com/media/en/technical-documentation/data-sheets/3015fb.pdf
footprint TO-263-5_TabPin3
pins: 1 ~{{SHDN}} (in), 2 GND (power), 3 IN (power), 4 SENSE (in), 5 OUT (power)

## LT3015xQ-3
designator *  value LT3015xQ-3
ki_keywords: negative voltage regulator; ki_description: -3V, 1.5A, Low Noise, Negative Linear Regulator with Precision Current Limit, TO-263-5; ki_fp_filters: TO*263*; Footprint: Package_TO_SOT_SMD:TO-263-5_TabPin3; Supplier: https://www.analog.com/media/en/technical-documentation/data-sheets/3015fb.pdf
footprint TO-263-5_TabPin3
pins: 1 ~{{SHDN}} (in), 2 GND (power), 3 IN (power), 4 SENSE (in), 5 OUT (power)

## LT3015xQ-3.3
designator *  value LT3015xQ-3.3
ki_keywords: negative voltage regulator; ki_description: -3.3V, 1.5A, Low Noise, Negative Linear Regulator with Precision Current Limit, TO-263-5; ki_fp_filters: TO*263*; Footprint: Package_TO_SOT_SMD:TO-263-5_TabPin3; Supplier: https://www.analog.com/media/en/technical-documentation/data-sheets/3015fb.pdf
footprint TO-263-5_TabPin3
pins: 1 ~{{SHDN}} (in), 2 GND (power), 3 IN (power), 4 SENSE (in), 5 OUT (power)

## LT3015xQ-5
designator *  value LT3015xQ-5
ki_keywords: negative voltage regulator; ki_description: -5V, 1.5A, Low Noise, Negative Linear Regulator with Precision Current Limit, TO-263-5; ki_fp_filters: TO*263*; Footprint: Package_TO_SOT_SMD:TO-263-5_TabPin3; Supplier: https://www.analog.com/media/en/technical-documentation/data-sheets/3015fb.pdf
footprint TO-263-5_TabPin3
pins: 1 ~{{SHDN}} (in), 2 GND (power), 3 IN (power), 4 SENSE (in), 5 OUT (power)

## LT3015xQ-12
designator *  value LT3015xQ-12
ki_keywords: negative voltage regulator; ki_description: -12V, 1.5A, Low Noise, Negative Linear Regulator with Precision Current Limit, TO-263-5; ki_fp_filters: TO*263*; Footprint: Package_TO_SOT_SMD:TO-263-5_TabPin3; Supplier: https://www.analog.com/media/en/technical-documentation/data-sheets/3015fb.pdf
footprint TO-263-5_TabPin3
pins: 1 ~{{SHDN}} (in), 2 GND (power), 3 IN (power), 4 SENSE (in), 5 OUT (power)

## LT3015xQ-15
designator *  value LT3015xQ-15
ki_keywords: negative voltage regulator; ki_description: -15V, 1.5A, Low Noise, Negative Linear Regulator with Precision Current Limit, TO-263-5; ki_fp_filters: TO*263*; Footprint: Package_TO_SOT_SMD:TO-263-5_TabPin3; Supplier: https://www.analog.com/media/en/technical-documentation/data-sheets/3015fb.pdf
footprint TO-263-5_TabPin3
pins: 1 ~{{SHDN}} (in), 2 GND (power), 3 IN (power), 4 SENSE (in), 5 OUT (power)

## LT3032
designator *  value LT3032
ki_keywords: LDO low noise; ki_description: 150mA, Dual Low Dropout Linear Regulator, Positive/Negative Low Noise, Adjustable Output, DFN-14; ki_fp_filters: Linear*DE14MA*; Footprint: Package_DFN_QFN:Linear_DE14MA; Supplier: https://www.analog.com/media/en/technical-documentation/data-sheets/3032ff.pdf
footprint Linear_DE14MA
part A pins: 1 OUTP (power), 2 ADJP (in), 3 BYPP, 4 GND (power), 12 ~{{SHDNP}} (in), 13 NC (in) hidden, 14 INP (power)
part B pins: 5 GND (power), 6 INN (power), 7 OUTN (power), 8 ADJN (in), 9 INN hidden, 10 ~{{SHDNN}} (in), 11 BYPN

## LT3032-3.3
designator *  value LT3032-3.3
ki_keywords: LDO low noise; ki_description: 150mA, Dual Low Dropout Linear Regulator, Positive/Negative Low Noise, 3.3V Output, DFN-14; ki_fp_filters: Linear*DE14MA*; Footprint: Package_DFN_QFN:Linear_DE14MA; Supplier: https://www.analog.com/media/en/technical-documentation/data-sheets/3032ff.pdf
footprint Linear_DE14MA
part A pins: 1 OUTP (power), 2 NC (in) hidden, 3 BYPP, 4 GND (power), 12 ~{{SHDNP}} (in), 13 NC (in) hidden, 14 INP (power)
part B pins: 5 GND (power), 6 INN (power), 7 OUTN (power), 8 NC (in) hidden, 9 INN hidden, 10 ~{{SHDNN}} (in), 11 BYPN

## LT3032-5
designator *  value LT3032-5
ki_keywords: LDO low noise; ki_description: 150mA, Dual Low Dropout Linear Regulator, Positive/Negative Low Noise, 5V Output, DFN-14; ki_fp_filters: Linear*DE14MA*; Footprint: Package_DFN_QFN:Linear_DE14MA; Supplier: https://www.analog.com/media/en/technical-documentation/data-sheets/3032ff.pdf
footprint Linear_DE14MA
part A pins: 1 OUTP (power), 2 NC (in) hidden, 3 BYPP, 4 GND (power), 12 ~{{SHDNP}} (in), 13 NC (in) hidden, 14 INP (power)
part B pins: 5 GND (power), 6 INN (power), 7 OUTN (power), 8 NC (in) hidden, 9 INN hidden, 10 ~{{SHDNN}} (in), 11 BYPN